# Altium integrated library Digital.IntLib: 61 symbols (part 3 of 3) (continued)
## TMS320F28069PNT (continued)
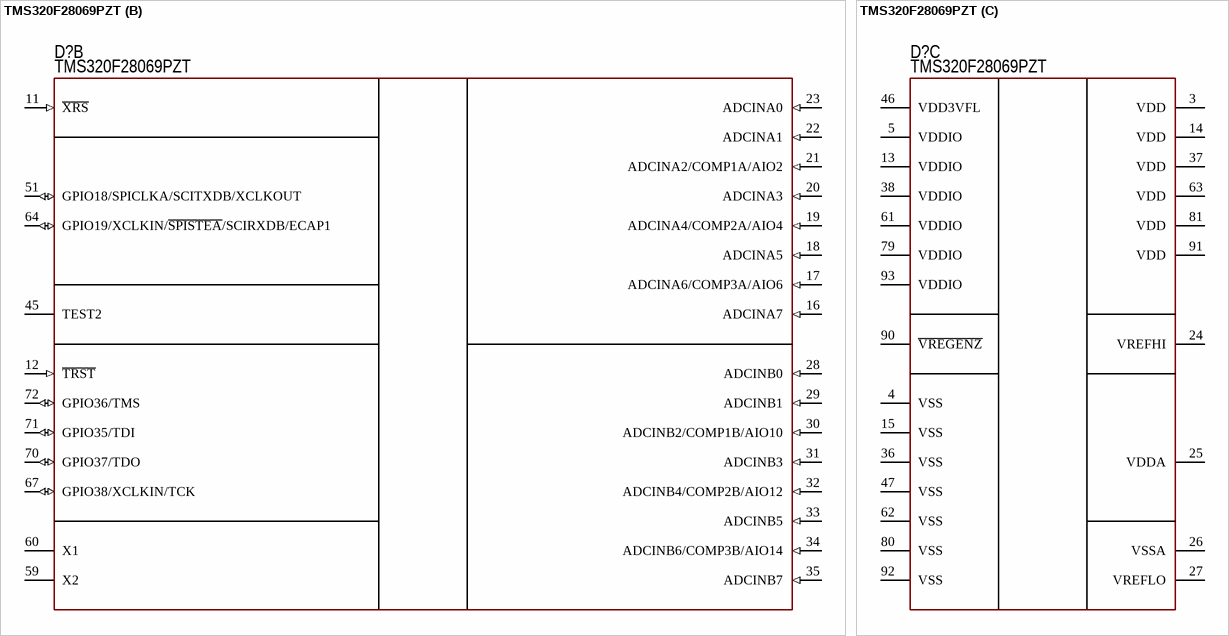
[diagram p25: symbol TMS320F28069PZT]

## TMS320F28069PZT
designator D?
DSP; Manufacturer: Texas Instruments; Model: TMS320F28069PZT; ComponentKind: 100-LQFP; HelpURL: https://www.digikey.com/product-detail/en/texas-instruments/TMS320F28069PZT/296-32765-ND/2797976
footprint 100-LQFP (Thin QFP, 100-Leads, Body 14x14mm, Pitch 0.5mm, IPC Medium Density)
part A pins: 1 GPIO42/EPWM8A/~{TZ1}/COMP1OUT (io), 2 GPIO23/EQEP1I/MFSXA/SCIRXDB (io), 6 GPIO20/EQEP1A/MDXA/COMP1OUT (io), 7 GPIO21/EQEP1B/MDRA/COMP2OUT (io), 8 GPIO43/EPWM8B/~{TZ2}/COMP2OUT (io), 9 GPIO4/EPWM3A (io), 10 GPIO5/EPWM3B/SPISIMOA/ECAP1 (io), 39 GPIO25/ECAP2/EQEP2B/SPISOMIB (io), 40 GPIO31/CANTXA/EQEP2S/EPWM8A (io), 41 GPIO30/CANRXA/EQEP2I/EPWM7A (io), 42 GPIO50/EQEP1A/MDXA/~{TZ1} (io), 43 GPIO29/SCITXDA/SCLA/~{TZ3} (io), 44 GPIO12/~{TZ1}/SCITXDA/SPISIMOB (io), 48 GPIO51/EQEP1B/MDRA/~{TZ2} (io), 49 GPIO9/EPWM5B/SCITXDB/ECAP3 (io), 50 GPIO28/SCIRXDA/SDAA/~{TZ2} (io), 52 GPIO17/SPISOMIA/~{TZ3} (io), 53 GPIO52/EQEP1S/MCLKXA/~{TZ3} (io), 54 GPIO8/EPWM5A/~{ADCSOCAO} (io), 55 GPIO16/SPISIMOA/~{TZ2} (io), 56 GPIO44/MFSRA/SCIRXDB/EPWM7B (io), 57 GPIO7/EPWM4B/SCIRXDA/ECAP2 (io), 58 GPIO6/EPWM4A/EPWMSYNCI/EPWMSYNCO (io), 65 GPIO53/EQEP1I/MFSXA (io), 66 GPIO39 (io), 68 GPIO34/COMP2OUT/COMP3OUT (io), 69 GPIO54/SPISIMOA/EQEP2A/HRCAP1 (io), 73 GPIO11/EPWM6B/SCIRXDB/ECAP1 (io), 74 GPIO10/EPWM6A/~{ADCSOCBO} (io), 75 GPIO55/SPISOMIA/EQEP2B/HRCAP2 (io), 76 GPIO41/EPWM7B/SCIRXDB (io), 77 GPIO27/HRCAP2/EQEP2S/~{SPISTEB}/USB0DM (io), 78 GPIO26/ECAP3/EQEP2I/SPICLKB/USB0DP (io), 82 GPIO40/EPWM7A/SCITXDB (io), 83 GPIO3/EPWM2B/SPISOMIA/COMP2OUT (io), 84 GPIO2/EPWM2A (io), 85 GPIO56/SPICLKA/EQEP2I/HRCAP3 (io), 86 GPIO1/EPWM1B/COMP1OUT (io), 87 GPIO0/EPWM1A (io), 88 GPIO15/ECAP2/SCIRXDB/~{SPISTEB} (io), 89 GPIO57/~{SPISTEA}/EQEP2S/HRCAP4 (io), 94 GPIO58/MCLKRA/SCITXDB/EPWM7A (io), 95 GPIO13/~{TZ2}/SPISOMIB (io), 96 GPIO14/~{TZ3}/SCITXDB/SPICLKB (io), 97 GPIO24/ECAP1I/EQEP2A/SPISIMOB (io), 98 GPIO22/EQEP1S/MCLKXA/SCITXDB (io), 99 GPIO32/SDAA/EPWMSYNCI/~{ADCSOCAO} (io), 100 GPIO33/SCLA/EPWMSYNCO/~{ADCSOCBO} (io)
part B pins: 11 ~{XRS} (in), 12 ~{TRST} (in), 16 ADCINA7 (in), 17 ADCINA6/COMP3A/AIO6 (in), 18 ADCINA5 (in), 19 ADCINA4/COMP2A/AIO4 (in), 20 ADCINA3 (in), 21 ADCINA2/COMP1A/AIO2 (in), 22 ADCINA1 (in), 23 ADCINA0 (in), 28 ADCINB0 (in), 29 ADCINB1 (in), 30 ADCINB2/COMP1B/AIO10 (in), 31 ADCINB3 (in), 32 ADCINB4/COMP2B/AIO12 (in), 33 ADCINB5 (in), 34 ADCINB6/COMP3B/AIO14 (in), 35 ADCINB7 (in), 45 TEST2, 51 GPIO18/SPICLKA/SCITXDB/XCLKOUT (io), 59 X2, 60 X1, 64 GPIO19/XCLKIN/~{SPISTEA}/SCIRXDB/ECAP1 (io), 67 GPIO38/XCLKIN/TCK (io), 70 GPIO37/TDO (io), 71 GPIO35/TDI (io), 72 GPIO36/TMS (io)
part C pins: 3 VDD, 4 VSS, 5 VDDIO, 13 VDDIO, 14 VDD, 15 VSS, 24 VREFHI, 25 VDDA, 26 VSSA, 27 VREFLO, 36 VSS, 37 VDD, 38 VDDIO, 46 VDD3VFL, 47 VSS, 61 VDDIO, 62 VSS, 63 VDD, 79 VDDIO, 80 VSS, 81 VDD, 90 ~{VREGENZ}, 91 VDD, 92 VSS, 93 VDDIO

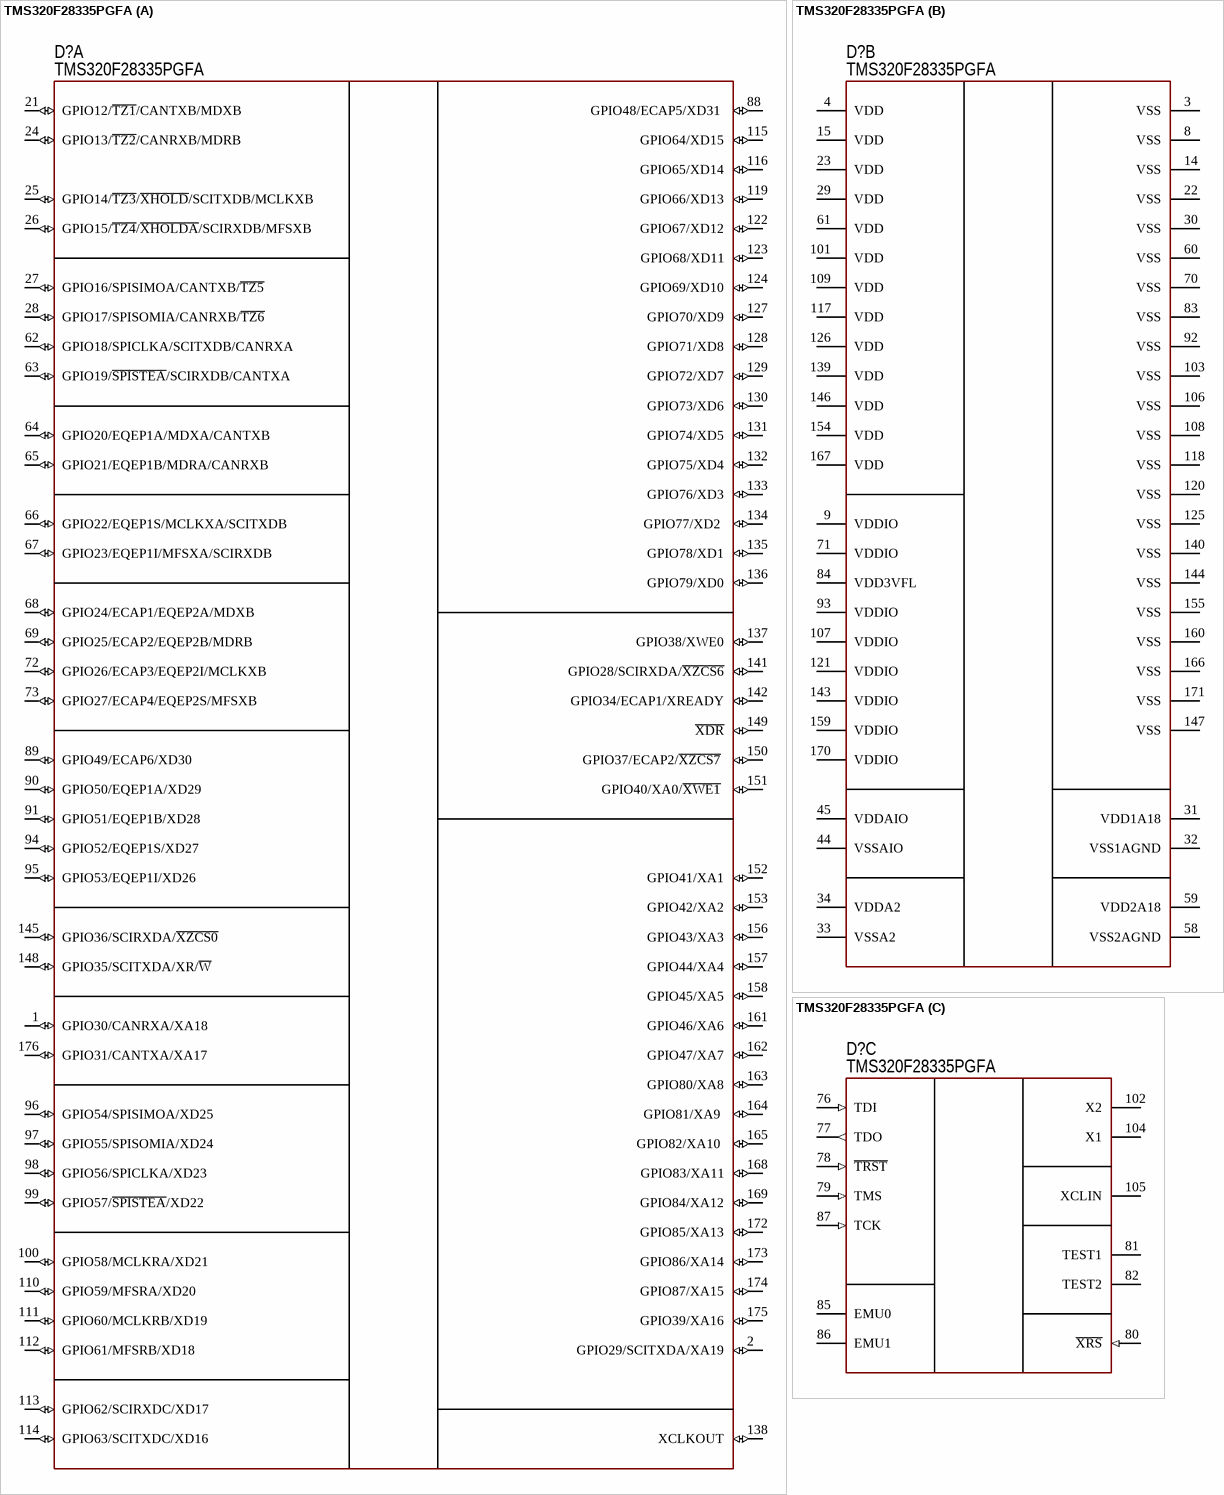
[diagram p26: symbol TMS320F28335PGFA]

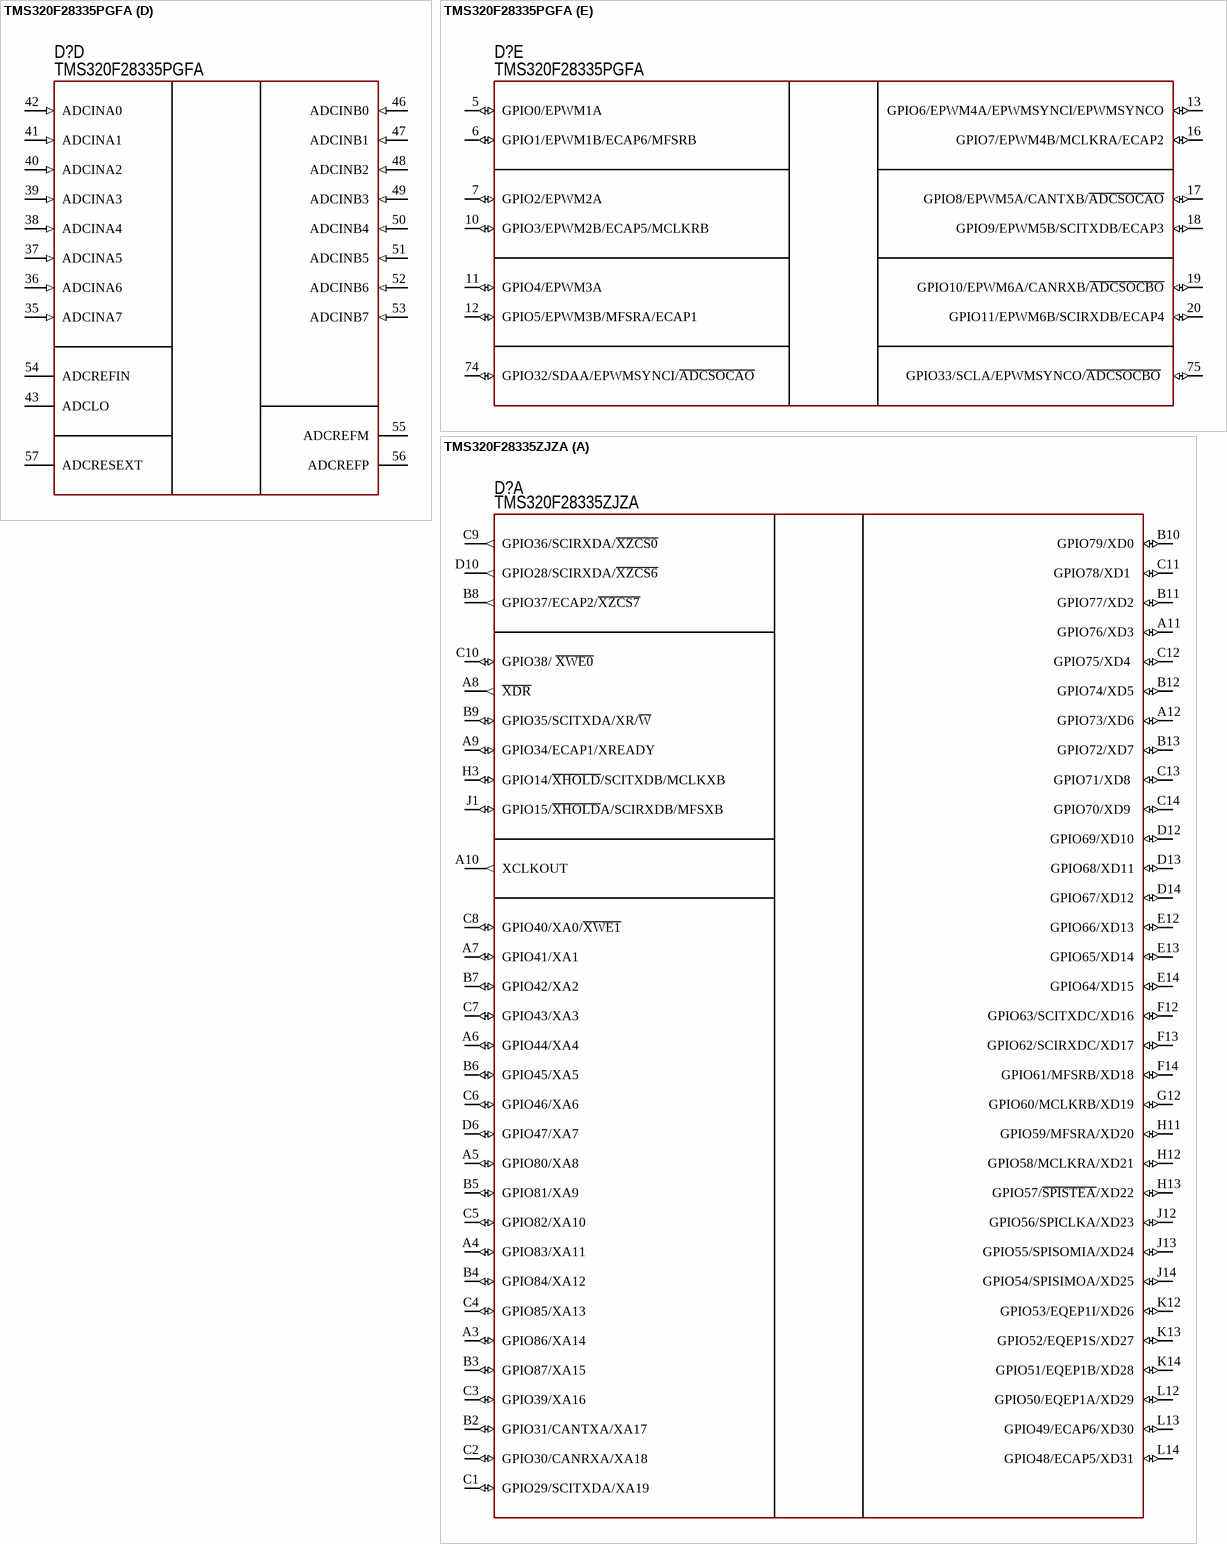
[diagram p27: symbols TMS320F28335PGFA to TMS320F28335ZJZA]

## TMS320F28335PGFA
designator D?
DSP; Manufacturer: Texas Instruments; Model: TMS320F28335PGFA; HelpURL: https://www.digikey.com/product-detail/en/texas-instruments/TMS320F28335PGFA/296-23660-ND/1907297; ComponentKind: 176-LQFP
footprint 176-LQFP (Thin QFP, 176-Leads, Body 24x24mm, Pitch 0.5mm, IPC Medium Density)
part A pins: 1 GPIO30/CANRXA/XA18 (io), 2 GPIO29/SCITXDA/XA19 (io), 21 GPIO12/~{TZ1}/CANTXB/MDXB (io), 24 GPIO13/~{TZ2}/CANRXB/MDRB (io), 25 GPIO14/~{TZ3}/~{XHOLD}/SCITXDB/MCLKXB (io), 26 GPIO15/~{TZ4}/~{XHOLDA}/SCIRXDB/MFSXB (io), 27 GPIO16/SPISIMOA/CANTXB/~{TZ5} (io), 28 GPIO17/SPISOMIA/CANRXB/~{TZ6} (io), 62 GPIO18/SPICLKA/SCITXDB/CANRXA (io), 63 GPIO19/~{SPISTEA}/SCIRXDB/CANTXA (io), 64 GPIO20/EQEP1A/MDXA/CANTXB  (io), 65 GPIO21/EQEP1B/MDRA/CANRXB (io), 66 GPIO22/EQEP1S/MCLKXA/SCITXDB (io), 67 GPIO23/EQEP1I/MFSXA/SCIRXDB (io), 68 GPIO24/ECAP1/EQEP2A/MDXB  (io), 69 GPIO25/ECAP2/EQEP2B/MDRB  (io), 72 GPIO26/ECAP3/EQEP2I/MCLKXB  (io), 73 GPIO27/ECAP4/EQEP2S/MFSXB (io), 88 GPIO48/ECAP5/XD31  (io), 89 GPIO49/ECAP6/XD30 (io), 90 GPIO50/EQEP1A/XD29 (io), 91 GPIO51/EQEP1B/XD28 (io), 94 GPIO52/EQEP1S/XD27 (io), 95 GPIO53/EQEP1I/XD26 (io), 96 GPIO54/SPISIMOA/XD25  (io), 97 GPIO55/SPISOMIA/XD24 (io), 98 GPIO56/SPICLKA/XD23 (io), 99 GPIO57/~{SPISTEA}/XD22 (io), 100 GPIO58/MCLKRA/XD21 (io), 110 GPIO59/MFSRA/XD20 (io), 111 GPIO60/MCLKRB/XD19 (io), 112 GPIO61/MFSRB/XD18 (io), 113 GPIO62/SCIRXDC/XD17 (io), 114 GPIO63/SCITXDC/XD16 (io), 115 GPIO64/XD15 (io), 116 GPIO65/XD14 (io), 119 GPIO66/XD13 (io), 122 GPIO67/XD12 (io), 123 GPIO68/XD11 (io), 124 GPIO69/XD10 (io), 127 GPIO70/XD9 (io), 128 GPIO71/XD8 (io), 129 GPIO72/XD7 (io), 130 GPIO73/XD6 (io), 131 GPIO74/XD5 (io), 132 GPIO75/XD4 (io), 133 GPIO76/XD3 (io), 134 GPIO77/XD2  (io), 135 GPIO78/XD1 (io), 136 GPIO79/XD0 (io), 137 GPIO38/XWE0 (io), 138 XCLKOUT (io), 141 GPIO28/SCIRXDA/~{XZCS6} (io), 142 GPIO34/ECAP1/XREADY (io), 145 GPIO36/SCIRXDA/~{XZCS0} (io), 148 GPIO35/SCITXDA/XR/~{W} (io), 149 ~{XDR} (io), 150 GPIO37/ECAP2/~{XZCS7}  (io), 151 GPIO40/XA0/~{XWE1}  (io), 152 GPIO41/XA1 (io), 153 GPIO42/XA2 (io), 156 GPIO43/XA3 (io), 157 GPIO44/XA4 (io), 158 GPIO45/XA5 (io), 161 GPIO46/XA6 (io), 162 GPIO47/XA7 (io), 163 GPIO80/XA8 (io), 164 GPIO81/XA9  (io), 165 GPIO82/XA10  (io), 168 GPIO83/XA11 (io), 169 GPIO84/XA12 (io), 172 GPIO85/XA13 (io), 173 GPIO86/XA14 (io), 174 GPIO87/XA15 (io), 175 GPIO39/XA16 (io), 176 GPIO31/CANTXA/XA17 (io)
part B pins: 3 VSS (power), 4 VDD (power), 8 VSS (power), 9 VDDIO (power), 14 VSS (power), 15 VDD (power), 22 VSS (power), 23 VDD (power), 29 VDD (power), 30 VSS (power), 31 VDD1A18 (power), 32 VSS1AGND (power), 33 VSSA2 (power), 34 VDDA2 (power), 44 VSSAIO (power), 45 VDDAIO (power), 58 VSS2AGND (power), 59 VDD2A18 (power), 60 VSS (power), 61 VDD (power), 70 VSS (power), 71 VDDIO (power), 83 VSS (power), 84 VDD3VFL (power), 92 VSS (power), 93 VDDIO (power), 101 VDD (power), 103 VSS (power), 106 VSS (power), 107 VDDIO (power), 108 VSS (power), 109 VDD (power), 117 VDD (power), 118 VSS (power), 120 VSS (power), 121 VDDIO (power), 125 VSS (power), 126 VDD (power), 139 VDD (power), 140 VSS (power), 143 VDDIO (power), 144 VSS (power), 146 VDD (power), 147 VSS (power), 154 VDD (power), 155 VSS (power), 159 VDDIO (power), 160 VSS (power), 166 VSS (power), 167 VDD (power), 170 VDDIO (power), 171 VSS (power)
part C pins: 76 TDI (in), 77 TDO (out), 78 ~{TRST} (in), 79 TMS (in), 80 ~{XRS} (in), 81 TEST1, 82 TEST2, 85 EMU0, 86 EMU1, 87 TCK (in), 102 X2, 104 X1, 105 XCLIN
part D pins: 35 ADCINA7 (in), 36 ADCINA6 (in), 37 ADCINA5 (in), 38 ADCINA4 (in), 39 ADCINA3 (in), 40 ADCINA2 (in), 41 ADCINA1 (in), 42 ADCINA0 (in), 43 ADCLO, 46 ADCINB0 (in), 47 ADCINB1 (in), 48 ADCINB2 (in), 49 ADCINB3 (in), 50 ADCINB4 (in), 51 ADCINB5 (in), 52 ADCINB6 (in), 53 ADCINB7 (in), 54 ADCREFIN, 55 ADCREFM, 56 ADCREFP, 57 ADCRESEXT
part E pins: 5 GPIO0/EPWM1A (io), 6 GPIO1/EPWM1B/ECAP6/MFSRB (io), 7 GPIO2/EPWM2A (io), 10 GPIO3/EPWM2B/ECAP5/MCLKRB (io), 11 GPIO4/EPWM3A (io), 12 GPIO5/EPWM3B/MFSRA/ECAP1 (io), 13 GPIO6/EPWM4A/EPWMSYNCI/EPWMSYNCO (io), 16 GPIO7/EPWM4B/MCLKRA/ECAP2 (io), 17 GPIO8/EPWM5A/CANTXB/~{ADCSOCAO} (io), 18 GPIO9/EPWM5B/SCITXDB/ECAP3 (io), 19 GPIO10/EPWM6A/CANRXB/~{ADCSOCBO} (io), 20 GPIO11/EPWM6B/SCIRXDB/ECAP4 (io), 74 GPIO32/SDAA/EPWMSYNCI/~{ADCSOCAO}  (io), 75 GPIO33/SCLA/EPWMSYNCO/~{ADCSOCBO}  (io)

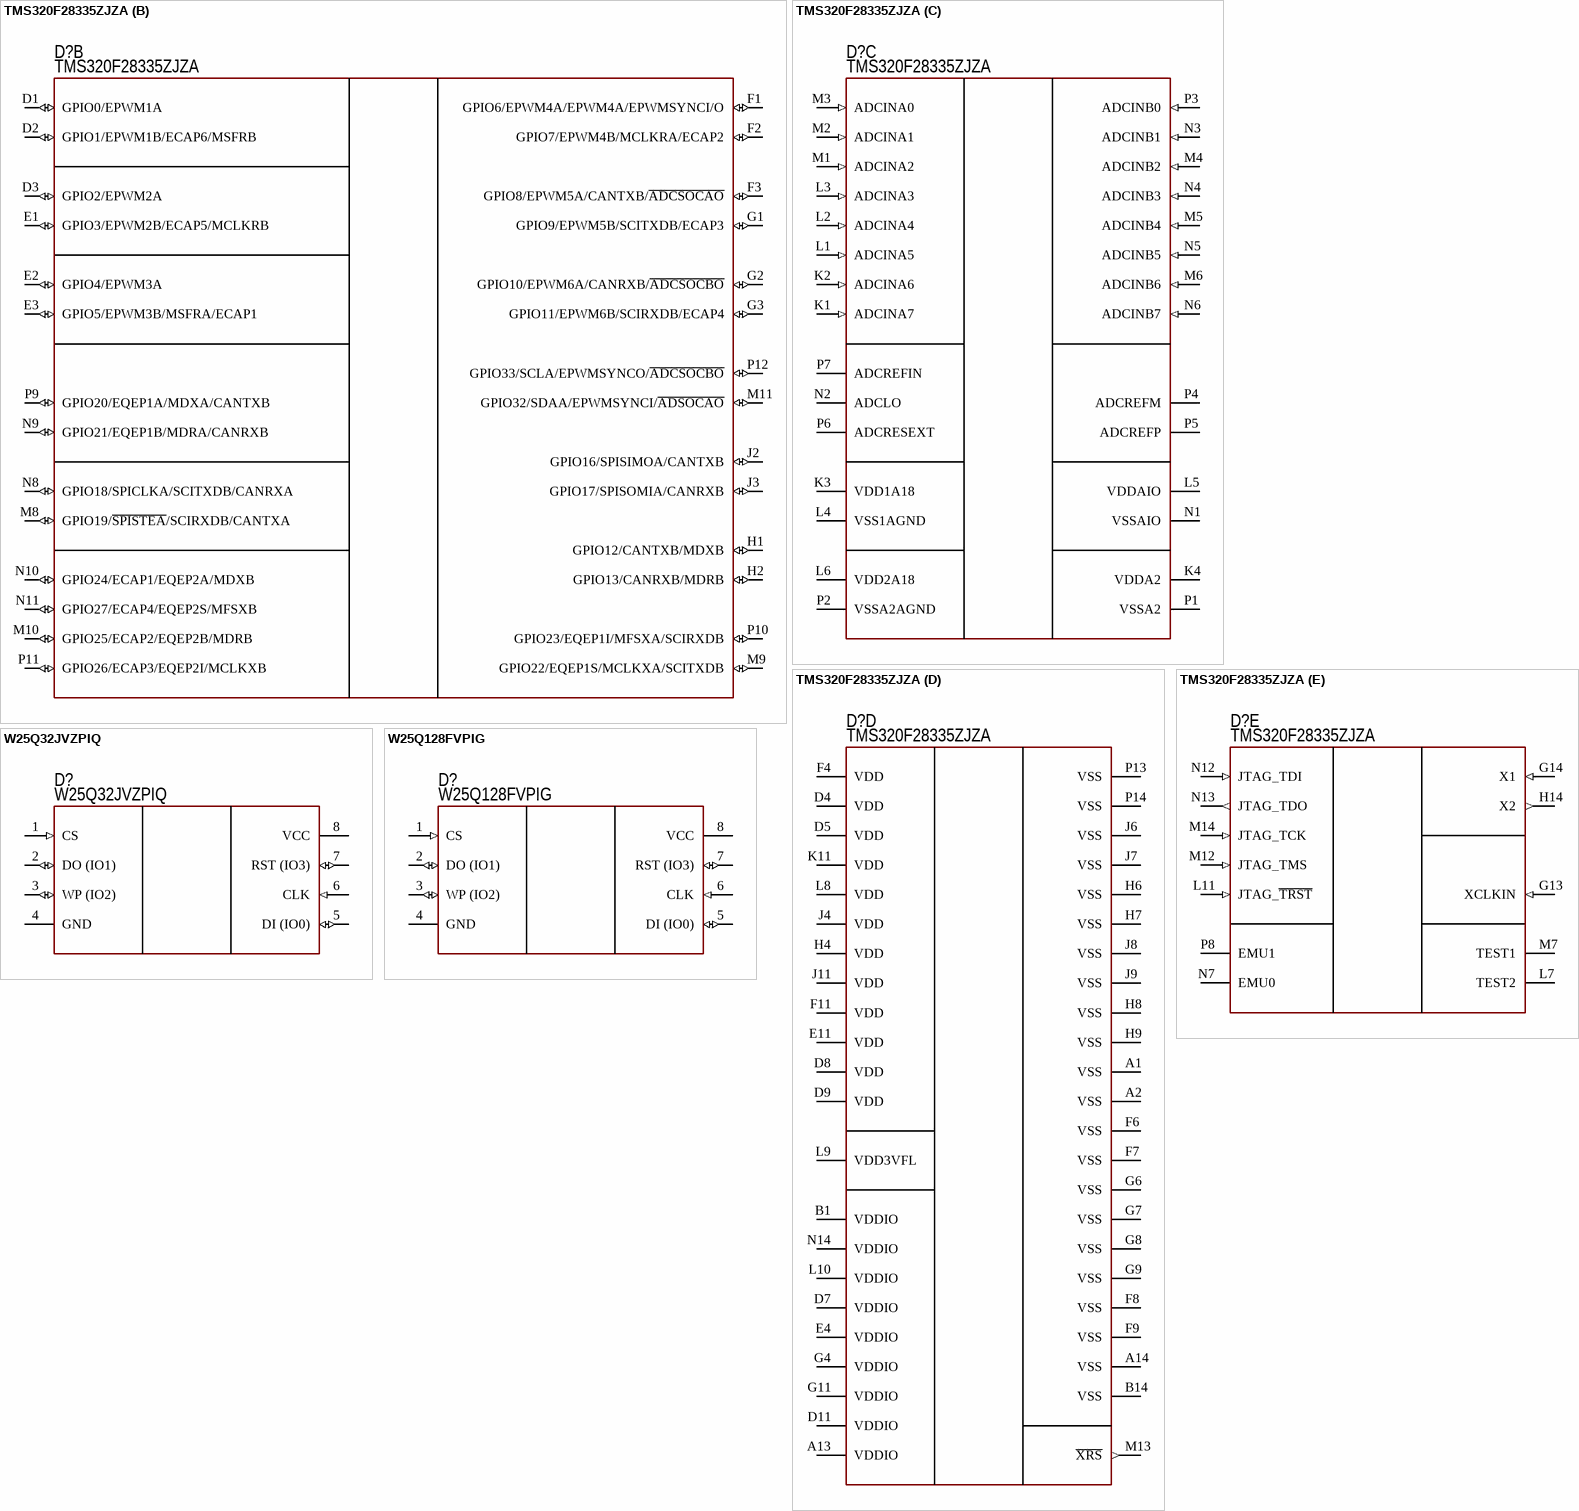
[diagram p28: symbols TMS320F28335ZJZA to W25Q128FVPIG]

## TMS320F28335ZJZA
designator D?
DSP; Manufacturer: Texas Instruments; Model: TMS320F28335ZJZA; HelpURL: https://www.digikey.com/products/en?keywords=TMS320F28335ZJZA; ComponentKind: 176-PBGA
footprint 176-PBGA
part A pins: A3 GPIO86/XA14 (io), A4 GPIO83/XA11 (io), A5 GPIO80/XA8 (io), A6 GPIO44/XA4 (io), A7 GPIO41/XA1 (io), A8 ~{XDR} (out), A9 GPIO34/ECAP1/XREADY (io), A10 XCLKOUT (out), A11 GPIO76/XD3 (io), A12 GPIO73/XD6 (io), B2 GPIO31/CANTXA/XA17 (io), B3 GPIO87/XA15 (io), B4 GPIO84/XA12 (io), B5 GPIO81/XA9 (io), B6 GPIO45/XA5 (io), B7 GPIO42/XA2 (io), B8 GPIO37/ECAP2/~{XZCS7} (out), B9 GPIO35/SCITXDA/XR/~{W} (io), B10 GPIO79/XD0 (io), B11 GPIO77/XD2 (io), B12 GPIO74/XD5 (io), B13 GPIO72/XD7 (io), C1 GPIO29/SCITXDA/XA19 (io), C2 GPIO30/CANRXA/XA18 (io), C3 GPIO39/XA16 (io), C4 GPIO85/XA13 (io), C5 GPIO82/XA10 (io), C6 GPIO46/XA6 (io), C7 GPIO43/XA3 (io), C8 GPIO40/XA0/~{XWE1} (io), C9 GPIO36/SCIRXDA/~{XZCS0}  (out), C10 GPIO38/ ~{XWE0} (io), C11 GPIO78/XD1  (io), C12 GPIO75/XD4  (io), C13 GPIO71/XD8  (io), C14 GPIO70/XD9  (io), D6 GPIO47/XA7 (io), D10 GPIO28/SCIRXDA/~{XZCS6} (out), D12 GPIO69/XD10 (io), D13 GPIO68/XD11 (io), D14 GPIO67/XD12 (io), E12 GPIO66/XD13 (io), E13 GPIO65/XD14 (io), E14 GPIO64/XD15 (io), F12 GPIO63/SCITXDC/XD16 (io), F13 GPIO62/SCIRXDC/XD17 (io), F14 GPIO61/MFSRB/XD18 (io), G12 GPIO60/MCLKRB/XD19 (io), H3 GPIO14/~{XHOLD}/SCITXDB/MCLKXB (io), H11 GPIO59/MFSRA/XD20 (io), H12 GPIO58/MCLKRA/XD21 (io), H13 GPIO57/~{SPISTEA}/XD22 (io), J1 GPIO15/~{XHOLD}A/SCIRXDB/MFSXB (io), J12 GPIO56/SPICLKA/XD23 (io), J13 GPIO55/SPISOMIA/XD24 (io), J14 GPIO54/SPISIMOA/XD25 (io), K12 GPIO53/EQEP1I/XD26 (io), K13 GPIO52/EQEP1S/XD27 (io), K14 GPIO51/EQEP1B/XD28 (io), L12 GPIO50/EQEP1A/XD29 (io), L13 GPIO49/ECAP6/XD30 (io), L14 GPIO48/ECAP5/XD31 (io)
part B pins: D1 GPIO0/EPWM1A (io), D2 GPIO1/EPWM1B/ECAP6/MSFRB (io), D3 GPIO2/EPWM2A (io), E1 GPIO3/EPWM2B/ECAP5/MCLKRB (io), E2 GPIO4/EPWM3A (io), E3 GPIO5/EPWM3B/MSFRA/ECAP1 (io), F1 GPIO6/EPWM4A/EPWM4A/EPWMSYNCI/O (io), F2 GPIO7/EPWM4B/MCLKRA/ECAP2 (io), F3 GPIO8/EPWM5A/CANTXB/~{ADCSOCAO} (io), G1 GPIO9/EPWM5B/SCITXDB/ECAP3 (io), G2 GPIO10/EPWM6A/CANRXB/~{ADCSOCBO} (io), G3 GPIO11/EPWM6B/SCIRXDB/ECAP4 (io), H1 GPIO12/CANTXB/MDXB (io), H2 GPIO13/CANRXB/MDRB (io), J2 GPIO16/SPISIMOA/CANTXB (io), J3 GPIO17/SPISOMIA/CANRXB (io), M8 GPIO19/~{SPISTEA}/SCIRXDB/CANTXA (io), M9 GPIO22/EQEP1S/MCLKXA/SCITXDB (io), M10 GPIO25/ECAP2/EQEP2B/MDRB (io), M11 GPIO32/SDAA/EPWMSYNCI/~{ADSOCAO} (io), N8 GPIO18/SPICLKA/SCITXDB/CANRXA (io), N9 GPIO21/EQEP1B/MDRA/CANRXB (io), N10 GPIO24/ECAP1/EQEP2A/MDXB (io), N11 GPIO27/ECAP4/EQEP2S/MFSXB (io), P9 GPIO20/EQEP1A/MDXA/CANTXB (io), P10 GPIO23/EQEP1I/MFSXA/SCIRXDB (io), P11 GPIO26/ECAP3/EQEP2I/MCLKXB (io), P12 GPIO33/SCLA/EPWMSYNCO/~{ADCSOCBO} (io)
part C pins: K1 ADCINA7 (in), K2 ADCINA6 (in), K3 VDD1A18 (power), K4 VDDA2 (power), L1 ADCINA5 (in), L2 ADCINA4 (in), L3 ADCINA3 (in), L4 VSS1AGND (power), L5 VDDAIO (power), L6 VDD2A18 (power), M1 ADCINA2 (in), M2 ADCINA1 (in), M3 ADCINA0 (in), M4 ADCINB2 (in), M5 ADCINB4 (in), M6 ADCINB6 (in), N1 VSSAIO (power), N2 ADCLO (power), N3 ADCINB1 (in), N4 ADCINB3 (in), N5 ADCINB5 (in), N6 ADCINB7 (in), P1 VSSA2 (power), P2 VSSA2AGND (power), P3 ADCINB0 (in), P4 ADCREFM (power), P5 ADCREFP (power), P6 ADCRESEXT (power), P7 ADCREFIN (power)
part D pins: A1 VSS (power), A2 VSS (power), A13 VDDIO (power), A14 VSS (power), B1 VDDIO (power), B14 VSS (power), D4 VDD (power), D5 VDD (power), D7 VDDIO (power), D8 VDD (power), D9 VDD (power), D11 VDDIO (power), E4 VDDIO (power), E11 VDD (power), F4 VDD (power), F6 VSS (power), F7 VSS (power), F8 VSS (power), F9 VSS (power), F11 VDD (power), G4 VDDIO (power), G6 VSS (power), G7 VSS (power), G8 VSS (power), G9 VSS (power), G11 VDDIO (power), H4 VDD (power), H6 VSS (power), H7 VSS (power), H8 VSS (power), H9 VSS (power), J4 VDD (power), J6 VSS (power), J7 VSS (power), J8 VSS (power), J9 VSS (power), J11 VDD (power), K11 VDD (power), L8 VDD (power), L9 VDD3VFL (power), L10 VDDIO (power), M13 ~{XRS} (out), N14 VDDIO (power), P13 VSS (power), P14 VSS (power)
part E pins: G13 XCLKIN (in), G14 X1 (in), H14 X2 (out), L7 TEST2 (hiz), L11 JTAG_~{TRST} (in), M7 TEST1 (hiz), M12 JTAG_TMS (in), M14 JTAG_TCK (in), N7 EMU0 (hiz), N12 JTAG_TDI (in), N13 JTAG_TDO (out), P8 EMU1 (hiz)

## W25Q32JVZPIQ
designator D?
Flash; Manufacturer: Winbond Electronics; Model: W25Q32JVZPIQ; HelpURL: https://www.digikey.com/product-detail/en/winbond-electronics/W25Q32JVZPIQ/W25Q32JVZPIQ-ND/6167525; ComponentKind: 8-WSON
footprint 8-WSON (5x6 mm) (SON, 8-Leads, Body 5,00x6,00mm, Pitch 1,27mm, Thermal Pad 4,30x3,40mm, IPC Medium Density)
pins: 1 CS (in), 2 DO (IO1) (io), 3 WP (IO2) (io), 4 GND (power), 5 DI (IO0) (io), 6 CLK (in), 7 RST (IO3) (io), 8 VCC (power)

## W25Q128FVPIG
designator D?
Flash; Manufacturer: Winbond Electronics; Model: W25Q128FVPIG; HelpURL: https://www.digikey.com/product-detail/en/winbond-electronics/W25Q128FVPIG/W25Q128FVPIG-ND/4037386; ComponentKind: 8-WSON
footprint 8-WSON (5x6 mm) (SON, 8-Leads, Body 5,00x6,00mm, Pitch 1,27mm, Thermal Pad 4,30x3,40mm, IPC Medium Density)
pins: 1 CS (in), 2 DO (IO1) (io), 3 WP (IO2) (io), 4 GND (power), 5 DI (IO0) (io), 6 CLK (in), 7 RST (IO3) (io), 8 VCC (power)